# Altium schematic symbol library Minh_Lib.SchLib: 619 symbols (part 3 of 4) (continued)
## EEE-1EA470WP
designator EEE?  Supplier Part Number 1: PCE3908CT-ND
Cap Aluminum 47uF 25V 20% (6.3 X 5.4mm) SMD 70mA 1000h 85°C T/R; Manufacturer: Panasonic; Manufacturer Part Number: EEE-1EA470WP; Life (Hours): 1000Hour; Supplier 1: Digi-Key; RoHS: Yes; Category: Aluminum Electrolytic Capacitors; Stock 1: 2589; Pricing 1: 1=0.45000, 10=0.31200, 50=0.21860, 100=0.18730, 500=0.14050 (USD); Mount: Surface Mount,PCB; Case/Package: Radial; Contact Plating: Tin; Min Operating Temperature: -40°C; Max Operating Temperature: 85°C; Capacitance: 47uF; Tolerance: 20%; Ripple Current: 70mA; Packaging: Tape and Reel; Voltage Rating: 25V; Voltage Rating (DC): 25V; Package Quantity: 1; Termination: SMD/SMT; Ripple Current (AC): 70mA; Series: S; Construction: Cylindrical; Diameter: 6.3mm; Length: 5.5mm; Height: 5.4mm; Height - Seated (Max): 0.213inch; Radiation Hardening: No; RoHS Compliant: Yes; REACH SVHC: Unknown; Lead Free: Lead Free; ComponentLink1URL: https://datasheet.ciiva.com/34302/1356009-34302242.pdf?src-supplier=Jameco; ComponentLink1Description: https://datasheet.ciiva.com/34302/1356009-34302242.pdf?src-supplier=Jameco; ComponentLink2URL: https://datasheet.ciiva.com/24068/aba0000ce2-40801-24068439.pdf?src-supplier=Mouser; ComponentLink2Description: https://datasheet.ciiva.com/24068/aba0000ce2-40801-24068439.pdf?src-supplier=Mouser; ComponentLink3URL: https://datasheet.ciiva.com/14599/70255710-14599015.pdf?src-supplier=Allied+Electronics; ComponentLink3Description: https://datasheet.ciiva.com/14599/70255710-14599015.pdf?src-supplier=Allied+Electronics; ComponentLink4URL: https://datasheet.ciiva.com/2985/aba0000ce2-2985137.pdf?src-supplier=Avnet; ComponentLink4Description: https://datasheet.ciiva.com/2985/aba0000ce2-2985137.pdf?src-supplier=Avnet; ComponentLink5URL: https://datasheet.ciiva.com/16201/aba0000ce2-16201990.pdf?src-supplier=Future+Electronics; ComponentLink5Description: https://datasheet.ciiva.com/16201/aba0000ce2-16201990.pdf?src-supplier=Future+Electronics; ComponentLink6URL: https://datasheet.ciiva.com/30153/11aba0000ce2-30153223.pdf?src-supplier=Onlinecomponents.com; ComponentLink6Description: https://datasheet.ciiva.com/30153/11aba0000ce2-30153223.pdf?src-supplier=Onlinecomponents.com; ComponentLink7URL: https://datasheet.ciiva.com/15166/getdatasheetpartid-135372-15166029.pdf?src-supplier=Verical; ComponentLink7Description: https://datasheet.ciiva.com/15166/getdatasheetpartid-135372-15166029.pdf?src-supplier=Verical; ComponentLink8URL: https://datasheet.ciiva.com/17536/aba0000ce2-17536076.pdf?src-supplier=Avnet+Europe; ComponentLink8Description: https://datasheet.ciiva.com/17536/aba0000ce2-17536076.pdf?src-supplier=Avnet+Europe; ComponentLink9URL: https://datasheet.ciiva.com/16539/aba0000ce2-16539946.pdf?src-supplier=Avnet+Asia; ComponentLink9Description: https://datasheet.ciiva.com/16539/aba0000ce2-16539946.pdf?src-supplier=Avnet+Asia
footprint CAPACITOR/ALU - SIZE D/SMD - 6.3X5.4 (CAPACITOR  -  ALUMINIUM - SIZE D / EEEFK - SMD)
pins: 1, 2
text: +

## EEE-1EA471P
designator EEE?  Supplier Part Number 1: PCE3909CT-ND
Cap Aluminum 470uF 25V 20% (10 X 10.2mm) SMD 380mA 2000h 85 C T/R; Manufacturer: Panasonic; Manufacturer Part Number: EEE-1EA471P; Dielectric Material: Aluminium; Polarity: Polar; Life (Hours): 2000Hour; Leakage Current: 117.5uA; Supplier 1: Digi-Key; RoHS: Yes; Category: Aluminum Electrolytic Capacitors; Pricing 1: 1=0.84000, 10=0.59100, 50=0.44700, 100=0.38940 (USD); Mount: Surface Mount,PCB; Case/Package: Radial; Contact Plating: Tin; Min Operating Temperature: -40°C; Max Operating Temperature: 85°C; Packaging: Tape and Reel; Capacitance: 470uF; Voltage Rating: 25V; Ripple Current (AC): 380mA; Tolerance: 20%; Ripple Current: 380mA; Voltage Rating (DC): 25V; Package Quantity: 500; Termination: SMD/SMT; Voltage: 25V; Series: S; Construction: Cylindrical; Diameter: 10mm; Length: 10.5mm; Height: 10.2mm; Height - Seated (Max): 0.402inch; Radiation Hardening: No; REACH SVHC: No SVHC; Lead Free: Lead Free; RoHS Compliant: Yes; ComponentLink1URL: https://datasheet.ciiva.com/31414/aba0000ce2-31414667.pdf?src-supplier=Farnell; ComponentLink1Description: https://datasheet.ciiva.com/31414/aba0000ce2-31414667.pdf?src-supplier=Farnell; ComponentLink2URL: https://datasheet.ciiva.com/46374/aba0000ce2-46374389.pdf?src-supplier=Element14; ComponentLink2Description: https://datasheet.ciiva.com/46374/aba0000ce2-46374389.pdf?src-supplier=Element14; ComponentLink3URL: https://datasheet.ciiva.com/14605/70255710-14605533.pdf?src-supplier=Allied+Electronics; ComponentLink3Description: https://datasheet.ciiva.com/14605/70255710-14605533.pdf?src-supplier=Allied+Electronics; ComponentLink4URL: https://datasheet.ciiva.com/14600/70255710-14600730.pdf?src-supplier=Allied+Electronics; ComponentLink4Description: https://datasheet.ciiva.com/14600/70255710-14600730.pdf?src-supplier=Allied+Electronics; ComponentLink5URL: https://datasheet.ciiva.com/2983/aba0000ce2-2983917.pdf?src-supplier=Avnet; ComponentLink5Description: https://datasheet.ciiva.com/2983/aba0000ce2-2983917.pdf?src-supplier=Avnet; ComponentLink6URL: https://datasheet.ciiva.com/16426/aba0000ce2-16426393.pdf?src-supplier=Future+Electronics; ComponentLink6Description: https://datasheet.ciiva.com/16426/aba0000ce2-16426393.pdf?src-supplier=Future+Electronics; ComponentLink7URL: https://datasheet.ciiva.com/17534/aba0000ce2-17534509.pdf?src-supplier=Avnet+Europe; ComponentLink7Description: https://datasheet.ciiva.com/17534/aba0000ce2-17534509.pdf?src-supplier=Avnet+Europe
footprint CAPACITOR/ALU - SIZE G/SMD - 10X10.2 (CAPACITOR  -  ALUMINIUM - SIZE G / EEEFK - SMD)
pins: 1, 2
text: +

## EEE-1HA2R2SR
designator EEE?  Supplier Part Number 1: 5369950
2.2uF 50 V dc Aluminium Electrolytic Capacitor; SV Series 2000h 4 (Dia.) x 5.4mm; Manufacturer: Panasonic; Manufacturer Part Number: EEE-1HA2R2SR; Ripple Current: 16mA; Tolerance: 20%; Voltage Rating: 50V; Polarity: Polar; Life (Hours): 2000Hour; Leakage Current: 3uA; Lead Length: 1.8mm; Supplier 1: RSComponents; RoHS: Yes; Category: Aluminum Electrolytic Capacitors; Stock 1: 490; Pricing 1: 5=0.21900, 25=0.21600, 375=0.11900, 1250=0.08900, 5=0.15800, 25=0.15600, 375=0.08600, 1250=0.06400 (USD); Mount: Surface Mount,PCB; Case/Package: Radial; Number of Pins: 2; Contact Plating: Tin; Dielectric Material: Aluminium; Min Operating Temperature: -40°C; Max Operating Temperature: 85°C; Capacitance: 2.2uF; Packaging: Tape and Reel; Package Quantity: 2000; Ripple Current (AC): 16mA; Voltage Rating (DC): 50V; Termination: SMD/SMT; Voltage: 50V; Series: S; Construction: Cylindrical; Diameter: 4mm; Length: 5.5mm; Width: 4.3mm; Height: 5.4mm; Height - Seated (Max): 0.213inch; Lead Pitch: 1mm; Radiation Hardening: No; REACH SVHC: No SVHC; Lead Free: Lead Free; RoHS Compliant: Yes; ComponentLink1URL: https://datasheet.ciiva.com/25613/0900766b8078636e-25613663.pdf?src-supplier=RSComponents; ComponentLink1Description: https://datasheet.ciiva.com/25613/0900766b8078636e-25613663.pdf?src-supplier=RSComponents; ComponentLink2URL: https://datasheet.ciiva.com/11784/0900766b8078636e-11784625.pdf?src-supplier=RSComponents; ComponentLink2Description: https://datasheet.ciiva.com/11784/0900766b8078636e-11784625.pdf?src-supplier=RSComponents; ComponentLink3URL: https://datasheet.ciiva.com/24027/aba0000ce2-40801-24027359.pdf?src-supplier=Mouser; ComponentLink3Description: https://datasheet.ciiva.com/24027/aba0000ce2-40801-24027359.pdf?src-supplier=Mouser; ComponentLink4URL: https://datasheet.ciiva.com/14604/70255710-14604635.pdf?src-supplier=Allied+Electronics; ComponentLink4Description: https://datasheet.ciiva.com/14604/70255710-14604635.pdf?src-supplier=Allied+Electronics; ComponentLink5URL: https://datasheet.ciiva.com/43485/aba0000ce2-43485622.pdf?src-supplier=Farnell; ComponentLink5Description: https://datasheet.ciiva.com/43485/aba0000ce2-43485622.pdf?src-supplier=Farnell; ComponentLink6URL: https://datasheet.ciiva.com/46387/aba0000ce2-46387980.pdf?src-supplier=Element14; ComponentLink6Description: https://datasheet.ciiva.com/46387/aba0000ce2-46387980.pdf?src-supplier=Element14; ComponentLink7URL: https://datasheet.ciiva.com/46376/aba0000ce2-46376363.pdf?src-supplier=Element14; ComponentLink7Description: https://datasheet.ciiva.com/46376/aba0000ce2-46376363.pdf?src-supplier=Element14; ComponentLink8URL: https://datasheet.ciiva.com/2985/aba0000ce2-2985163.pdf?src-supplier=Avnet; ComponentLink8Description: https://datasheet.ciiva.com/2985/aba0000ce2-2985163.pdf?src-supplier=Avnet; ComponentLink9URL: https://datasheet.ciiva.com/15166/getdatasheetpartid-178541-15166252.pdf?src-supplier=Verical; ComponentLink9Description: https://datasheet.ciiva.com/15166/getdatasheetpartid-178541-15166252.pdf?src-supplier=Verical; ComponentLink10URL: https://datasheet.ciiva.com/30177/11aba0000ce2-30177741.pdf?src-supplier=Onlinecomponents.com; ComponentLink10Description: https://datasheet.ciiva.com/30177/11aba0000ce2-30177741.pdf?src-supplier=Onlinecomponents.com
footprint CAPACITOR/ALU - SIZE B/SMD - 4X5.4 (CAPACITOR  -  ALUMINIUM - SIZE B / EEEFK - SMD)
pins: 1, 2
text: +

## EEE-1HA3R3SR
designator EEE?  Supplier Part Number 1: EEE-1HA3R3SR
Cap Aluminum 3.3uF 50V 20% (4 X 5.4mm) SMD 16mA 2000 hr 85°C T/R; Manufacturer: Panasonic; Dielectric Material: Aluminium; Life (Hours): 2000Hour; Polarity: Polar; Leakage Current: 3uA; Lead Length: 1.8mm; Supplier 1: Arrow Electronics; Manufacturer Part Number: EEE-1HA3R3SR; RoHS: Yes; Category: Aluminum Electrolytic Capacitors; Stock 1: 1; Pricing 1: 1=0.18170 (USD); Mount: Surface Mount,PCB; Case/Package: Radial; Number of Pins: 2; Min Operating Temperature: -40°C; Max Operating Temperature: 85°C; Capacitance: 3.3uF; Voltage Rating: 50V; Packaging: Tape and Reel; Tolerance: 20%; Voltage Rating (DC): 50V; Package Quantity: 2000; Ripple Current (AC): 16mA; Ripple Current: 16mA; Termination: SMD/SMT; Voltage: 50V; Series: S; Construction: Cylindrical; Diameter: 4mm; Length: 5.5mm; Width: 4.3mm; Height: 5.4mm; Height - Seated (Max): 0.213inch; Lead Pitch: 1mm; Radiation Hardening: No; Lead Free: Lead Free; REACH SVHC: No SVHC; RoHS Compliant: Yes; ComponentLink1URL: https://datasheet.ciiva.com/11784/0900766b8078636e-11784642.pdf?src-supplier=RSComponents; ComponentLink1Description: https://datasheet.ciiva.com/11784/0900766b8078636e-11784642.pdf?src-supplier=RSComponents; ComponentLink2URL: https://datasheet.ciiva.com/43485/aba0000ce2-43485623.pdf?src-supplier=Farnell; ComponentLink2Description: https://datasheet.ciiva.com/43485/aba0000ce2-43485623.pdf?src-supplier=Farnell; ComponentLink3URL: https://datasheet.ciiva.com/46376/aba0000ce2-46376362.pdf?src-supplier=Element14; ComponentLink3Description: https://datasheet.ciiva.com/46376/aba0000ce2-46376362.pdf?src-supplier=Element14; ComponentLink4URL: https://datasheet.ciiva.com/2985/aba0000ce2-2985170.pdf?src-supplier=Avnet; ComponentLink4Description: https://datasheet.ciiva.com/2985/aba0000ce2-2985170.pdf?src-supplier=Avnet; ComponentLink5URL: https://datasheet.ciiva.com/16390/aba0000ce2-16390475.pdf?src-supplier=Future+Electronics; ComponentLink5Description: https://datasheet.ciiva.com/16390/aba0000ce2-16390475.pdf?src-supplier=Future+Electronics
footprint CAPACITOR/ALU - SIZE B/SMD - 4X5.4 (CAPACITOR  -  ALUMINIUM - SIZE B / EEEFK - SMD)
pins: 1, 2
text: +

## EEE-1HA4R7SR
designator EEE?  Supplier Part Number 1: 7271054
Cap Aluminum 4.7uF 50V 20% (5 X 5.4mm) SMD 23mA 2000 hr 85°C T/R; Manufacturer: Panasonic; Manufacturer Part Number: EEE-1HA4R7SR; Dielectric Material: Aluminium; Life (Hours): 2000Hour; Leakage Current: 3uA; Lead Length: 2.2mm; Supplier 1: RSComponents; RoHS: Yes; Category: Aluminum Electrolytic Capacitors; Stock 1: 46225; Pricing 1: 25=0.24000, 50=0.20400, 100=0.18000, 500=0.15500, 2000=0.14400, 25=0.17300, 50=0.14700, 100=0.13000, 500=0.11200, 2000=0.10400 (USD); Mount: Surface Mount,PCB; Case/Package: Radial; Number of Pins: 2; Contact Plating: Tin; Min Operating Temperature: -40°C; Max Operating Temperature: 85°C; Capacitance: 4.7uF; Voltage Rating: 50V; Packaging: Tape and Reel; Tolerance: 20%; Voltage Rating (DC): 50V; Package Quantity: 1; Termination: SMD/SMT; Voltage: 50V; Series: S; Ripple Current (AC): 23mA; Ripple Current: 23mA; Construction: Cylindrical; Diameter: 5mm; Length: 5.5mm; Width: 5.3mm; Height: 5.4mm; Height - Seated (Max): 0.213inch; Lead Pitch: 1.5mm; Radiation Hardening: No; REACH SVHC: No SVHC; RoHS Compliant: Yes; Lead Free: Lead Free; ComponentLink1URL: https://datasheet.ciiva.com/11784/0900766b80f32c0f-11784877.pdf?src-supplier=RSComponents; ComponentLink1Description: https://datasheet.ciiva.com/11784/0900766b80f32c0f-11784877.pdf?src-supplier=RSComponents; ComponentLink2URL: https://datasheet.ciiva.com/24071/aba0000ce2-40801-24071194.pdf?src-supplier=Mouser; ComponentLink2Description: https://datasheet.ciiva.com/24071/aba0000ce2-40801-24071194.pdf?src-supplier=Mouser; ComponentLink3URL: https://datasheet.ciiva.com/14608/70255710-14608013.pdf?src-supplier=Allied+Electronics; ComponentLink3Description: https://datasheet.ciiva.com/14608/70255710-14608013.pdf?src-supplier=Allied+Electronics; ComponentLink4URL: https://datasheet.ciiva.com/14600/70255710-14600057.pdf?src-supplier=Allied+Electronics; ComponentLink4Description: https://datasheet.ciiva.com/14600/70255710-14600057.pdf?src-supplier=Allied+Electronics; ComponentLink5URL: https://datasheet.ciiva.com/43485/aba0000ce2-43485624.pdf?src-supplier=Farnell; ComponentLink5Description: https://datasheet.ciiva.com/43485/aba0000ce2-43485624.pdf?src-supplier=Farnell; ComponentLink6URL: https://datasheet.ciiva.com/46376/aba0000ce2-46376361.pdf?src-supplier=Element14; ComponentLink6Description: https://datasheet.ciiva.com/46376/aba0000ce2-46376361.pdf?src-supplier=Element14; ComponentLink7URL: https://datasheet.ciiva.com/2985/aba0000ce2-2985178.pdf?src-supplier=Avnet; ComponentLink7Description: https://datasheet.ciiva.com/2985/aba0000ce2-2985178.pdf?src-supplier=Avnet; ComponentLink8URL: https://datasheet.ciiva.com/16426/aba0000ce2-16426997.pdf?src-supplier=Future+Electronics; ComponentLink8Description: https://datasheet.ciiva.com/16426/aba0000ce2-16426997.pdf?src-supplier=Future+Electronics; ComponentLink9URL: https://datasheet.ciiva.com/30131/11aba0000ce2-30131807.pdf?src-supplier=Onlinecomponents.com; ComponentLink9Description: https://datasheet.ciiva.com/30131/11aba0000ce2-30131807.pdf?src-supplier=Onlinecomponents.com; ComponentLink10URL: https://datasheet.ciiva.com/16539/aba0000ce2-16539951.pdf?src-supplier=Avnet+Asia; ComponentLink10Description: https://datasheet.ciiva.com/16539/aba0000ce2-16539951.pdf?src-supplier=Avnet+Asia
footprint CAPACITOR/ALU - SIZE C/SMD - 5X5.4 (CAPACITOR  -  ALUMINIUM - SIZE C / EEEFK - SMD)
pins: 1, 2
text: +

## EEE-1HA4R7WR
designator EEE?  Supplier Part Number 1: 667-EEE-1HA4R7WR
Cap Aluminum 4.7uF 50V 20% (4 X 5.4mm) SMD 18mA 1000h 85°C T/R; Manufacturer: Panasonic; Manufacturer Part Number: EEE-1HA4R7WR; Polarity: Polar; Life (Hours): 1000Hour; Supplier 1: Mouser; RoHS: Yes; Category: Aluminum Electrolytic Capacitors; Stock 1: 6; Pricing 1: 1=0.36000, 10=0.25000, 50=0.25000, 100=0.14200, 1000=0.08800, 10000=0.08300 (USD); Mount: Surface Mount,PCB; Case/Package: Radial; Contact Plating: Tin; Min Operating Temperature: -40°C; Max Operating Temperature: 85°C; Capacitance: 4.7uF; Tolerance: 20%; Voltage Rating: 50V; Packaging: Tape and Reel; Ripple Current: 18mA; Package Quantity: 2000; Voltage Rating (DC): 50V; Termination: SMD/SMT; Ripple Current (AC): 18mA; Series: S; Construction: Cylindrical; Diameter: 4mm; Length: 5.5mm; Height: 5.4mm; Height - Seated (Max): 0.213inch; Radiation Hardening: No; Lead Free: Lead Free; RoHS Compliant: Yes; REACH SVHC: No SVHC; ComponentLink1URL: https://datasheet.ciiva.com/43470/aba0000ce2-43470678.pdf?src-supplier=Farnell; ComponentLink1Description: https://datasheet.ciiva.com/43470/aba0000ce2-43470678.pdf?src-supplier=Farnell; ComponentLink2URL: https://datasheet.ciiva.com/46378/aba0000ce2-46378350.pdf?src-supplier=Element14; ComponentLink2Description: https://datasheet.ciiva.com/46378/aba0000ce2-46378350.pdf?src-supplier=Element14; ComponentLink3URL: https://datasheet.ciiva.com/31414/aba0000ce2-31414686.pdf?src-supplier=Farnell; ComponentLink3Description: https://datasheet.ciiva.com/31414/aba0000ce2-31414686.pdf?src-supplier=Farnell; ComponentLink4URL: https://datasheet.ciiva.com/24069/aba0000ce2-40801-24069903.pdf?src-supplier=Mouser; ComponentLink4Description: https://datasheet.ciiva.com/24069/aba0000ce2-40801-24069903.pdf?src-supplier=Mouser; ComponentLink5URL: https://datasheet.ciiva.com/14600/70255710-14600316.pdf?src-supplier=Allied+Electronics; ComponentLink5Description: https://datasheet.ciiva.com/14600/70255710-14600316.pdf?src-supplier=Allied+Electronics; ComponentLink6URL: https://datasheet.ciiva.com/14592/70255710-14592504.pdf?src-supplier=Allied+Electronics; ComponentLink6Description: https://datasheet.ciiva.com/14592/70255710-14592504.pdf?src-supplier=Allied+Electronics; ComponentLink7URL: https://datasheet.ciiva.com/2985/aba0000ce2-2985181.pdf?src-supplier=Avnet; ComponentLink7Description: https://datasheet.ciiva.com/2985/aba0000ce2-2985181.pdf?src-supplier=Avnet; ComponentLink8URL: https://datasheet.ciiva.com/16393/aba0000ce2-16393141.pdf?src-supplier=Future+Electronics; ComponentLink8Description: https://datasheet.ciiva.com/16393/aba0000ce2-16393141.pdf?src-supplier=Future+Electronics; ComponentLink9URL: https://datasheet.ciiva.com/30116/11aba0000ce2-30116602.pdf?src-supplier=Onlinecomponents.com; ComponentLink9Description: https://datasheet.ciiva.com/30116/11aba0000ce2-30116602.pdf?src-supplier=Onlinecomponents.com
footprint CAPACITOR/ALU - SIZE B/SMD - 4X5.4 (CAPACITOR  -  ALUMINIUM - SIZE B / EEEFK - SMD)
pins: 1, 2
text: +

## EEE-1HA010SR
designator EEE?  Supplier Part Number 1: 5369922
Cap Aluminum 1uF 50V 20% (4 X 5.4mm) SMD 10mA 2000h 85°C T/R; Manufacturer: Panasonic; Manufacturer Part Number: EEE-1HA010SR; Dielectric Material: Aluminium; Polarity: Polar; Life (Hours): 2000Hour; Leakage Current: 3uA; Lead Length: 1.8mm; Supplier 1: RSComponents; RoHS: Yes; Category: Aluminum Electrolytic Capacitors; Stock 1: 3070; Pricing 1: 5=0.24100, 50=0.15500, 100=0.14700, 500=0.11100, 1000=0.09700, 5=0.17400, 50=0.11200, 100=0.10600, 500=0.08000, 1000=0.07000 (USD); Mount: Surface Mount,PCB; Case/Package: Radial; Number of Pins: 2; Contact Plating: Tin; Min Operating Temperature: -40°C; Max Operating Temperature: 85°C; Tolerance: 20%; Capacitance: 1uF; Packaging: Tape and Reel; Voltage Rating: 50V; Voltage Rating (DC): 50V; Package Quantity: 2000; Termination: SMD/SMT; Voltage: 50V; Series: S; Construction: Cylindrical; Ripple Current: 10mA; Ripple Current (AC): 10mA; Diameter: 4mm; Length: 5.5mm; Width: 4.3mm; Height: 5.4mm; Height - Seated (Max): 0.213inch; Lead Pitch: 1mm; Radiation Hardening: No; RoHS Compliant: Yes; REACH SVHC: No SVHC; Lead Free: Lead Free; ComponentLink1URL: https://datasheet.ciiva.com/34302/1356113-34302243.pdf?src-supplier=Jameco; ComponentLink1Description: https://datasheet.ciiva.com/34302/1356113-34302243.pdf?src-supplier=Jameco; ComponentLink2URL: https://datasheet.ciiva.com/11778/0900766b8078636e-11778406.pdf?src-supplier=RSComponents; ComponentLink2Description: https://datasheet.ciiva.com/11778/0900766b8078636e-11778406.pdf?src-supplier=RSComponents; ComponentLink3URL: https://datasheet.ciiva.com/24023/aba0000ce2-40801-24023829.pdf?src-supplier=Mouser; ComponentLink3Description: https://datasheet.ciiva.com/24023/aba0000ce2-40801-24023829.pdf?src-supplier=Mouser; ComponentLink4URL: https://datasheet.ciiva.com/43485/aba0000ce2-43485621.pdf?src-supplier=Farnell; ComponentLink4Description: https://datasheet.ciiva.com/43485/aba0000ce2-43485621.pdf?src-supplier=Farnell; ComponentLink5URL: https://datasheet.ciiva.com/46387/aba0000ce2-46387976.pdf?src-supplier=Element14; ComponentLink5Description: https://datasheet.ciiva.com/46387/aba0000ce2-46387976.pdf?src-supplier=Element14; ComponentLink6URL: https://datasheet.ciiva.com/6059/aba0000ce2-6059903.pdf?src-supplier=Farnell; ComponentLink6Description: https://datasheet.ciiva.com/6059/aba0000ce2-6059903.pdf?src-supplier=Farnell; ComponentLink7URL: https://datasheet.ciiva.com/46376/aba0000ce2-46376366.pdf?src-supplier=Element14; ComponentLink7Description: https://datasheet.ciiva.com/46376/aba0000ce2-46376366.pdf?src-supplier=Element14; ComponentLink8URL: https://datasheet.ciiva.com/2985/aba0000ce2-2985145.pdf?src-supplier=Avnet; ComponentLink8Description: https://datasheet.ciiva.com/2985/aba0000ce2-2985145.pdf?src-supplier=Avnet; ComponentLink9URL: https://datasheet.ciiva.com/3773/41677485s8438002n1386-3773589.pdf?src-supplier=Arrow+Electronics; ComponentLink9Description: https://datasheet.ciiva.com/3773/41677485s8438002n1386-3773589.pdf?src-supplier=Arrow+Electronics; ComponentLink10URL: https://datasheet.ciiva.com/16449/aba0000ce2-16449541.pdf?src-supplier=Future+Electronics; ComponentLink10Description: https://datasheet.ciiva.com/16449/aba0000ce2-16449541.pdf?src-supplier=Future+Electronics; ComponentLink11URL: https://datasheet.ciiva.com/17537/aba0000ce2-17537068.pdf?src-supplier=Avnet+Europe; ComponentLink11Description: https://datasheet.ciiva.com/17537/aba0000ce2-17537068.pdf?src-supplier=Avnet+Europe
footprint CAPACITOR/ALU - SIZE B/SMD - 4X5.4 (CAPACITOR  -  ALUMINIUM - SIZE B / EEEFK - SMD)
pins: 1, 2
text: +

## EEE-1HA100SP
designator EEE?  Supplier Part Number 1: 5369944
Cap Aluminum 10uF 50V 20% (6.3 X 5.4mm) SMD 35mA 2000h 85 C T/R; Manufacturer: Panasonic; Manufacturer Part Number: EEE-1HA100SP; Polarity: Polar; Life (Hours): 2000Hour; Leakage Current: 3uA; Lead Length: 2.6mm; Supplier 1: RSComponents; RoHS: Yes; Category: Aluminum Electrolytic Capacitors; Stock 1: 1; Pricing 1: 5=0.36000, 250=0.15000, 500=0.10500, 2500=0.07500, 5000=0.07200 (USD); Mount: Surface Mount,PCB; Case/Package: Radial; Number of Pins: 2; Contact Plating: Tin; Min Operating Temperature: -40°C; Max Operating Temperature: 85°C; Capacitance: 10uF; Tolerance: 20%; Ripple Current: 35mA; Packaging: Tape and Reel; Voltage Rating (DC): 50V; Voltage Rating: 50V; Package Quantity: 1; Ripple Current (AC): 35mA; Termination: SMD/SMT; Voltage: 50V; Series: S; Construction: Cylindrical; Diameter: 6.3mm; Length: 5.5mm; Width: 6.6mm; Height: 5.4mm; Height - Seated (Max): 0.213inch; Lead Pitch: 1.8mm; Radiation Hardening: No; REACH SVHC: No SVHC; RoHS Compliant: Yes; ComponentLink1URL: https://datasheet.ciiva.com/11784/0900766b8078636e-11784606.pdf?src-supplier=RSComponents; ComponentLink1Description: https://datasheet.ciiva.com/11784/0900766b8078636e-11784606.pdf?src-supplier=RSComponents; ComponentLink2URL: https://datasheet.ciiva.com/24025/aba0000ce2-40801-24025692.pdf?src-supplier=Mouser; ComponentLink2Description: https://datasheet.ciiva.com/24025/aba0000ce2-40801-24025692.pdf?src-supplier=Mouser; ComponentLink3URL: https://datasheet.ciiva.com/14593/70255710-14593928.pdf?src-supplier=Allied+Electronics; ComponentLink3Description: https://datasheet.ciiva.com/14593/70255710-14593928.pdf?src-supplier=Allied+Electronics; ComponentLink4URL: https://datasheet.ciiva.com/43485/aba0000ce2-43485625.pdf?src-supplier=Farnell; ComponentLink4Description: https://datasheet.ciiva.com/43485/aba0000ce2-43485625.pdf?src-supplier=Farnell; ComponentLink5URL: https://datasheet.ciiva.com/46387/aba0000ce2-46387978.pdf?src-supplier=Element14; ComponentLink5Description: https://datasheet.ciiva.com/46387/aba0000ce2-46387978.pdf?src-supplier=Element14; ComponentLink6URL: https://datasheet.ciiva.com/46376/aba0000ce2-46376364.pdf?src-supplier=Element14; ComponentLink6Description: https://datasheet.ciiva.com/46376/aba0000ce2-46376364.pdf?src-supplier=Element14; ComponentLink7URL: https://datasheet.ciiva.com/10330/aba0000ce2-10330991.pdf?src-supplier=Avnet; ComponentLink7Description: https://datasheet.ciiva.com/10330/aba0000ce2-10330991.pdf?src-supplier=Avnet; ComponentLink8URL: https://datasheet.ciiva.com/16397/aba0000ce2-16397354.pdf?src-supplier=Future+Electronics; ComponentLink8Description: https://datasheet.ciiva.com/16397/aba0000ce2-16397354.pdf?src-supplier=Future+Electronics; ComponentLink9URL: https://datasheet.ciiva.com/30261/11aba0000ce2-30261191.pdf?src-supplier=Onlinecomponents.com; ComponentLink9Description: https://datasheet.ciiva.com/30261/11aba0000ce2-30261191.pdf?src-supplier=Onlinecomponents.com
footprint CAPACITOR/ALU - SIZE D/SMD - 6.3X5.4 (CAPACITOR  -  ALUMINIUM - SIZE D / EEEFK - SMD)
pins: 1, 2
text: +

## EEE-1HA100WR
designator EEE?  Supplier Part Number 1: EEE-1HA100WR
Cap Aluminum 10uF 50V 20% (5 X 5.4mm) SMD 27mA 1000h 85°C T/R; Manufacturer: Panasonic; Life (Hours): 1000Hour; Supplier 1: Avnet; Manufacturer Part Number: EEE-1HA100WR; RoHS: Yes; Category: Aluminum Electrolytic Capacitors; Stock 1: 4; Pricing 1: 1=0.05300, 16=0.05173, 32=0.05046, 63=0.04918, 125=0.04791 (USD); Mount: Surface Mount,PCB; Case/Package: Radial; Contact Plating: Tin; Min Operating Temperature: -40°C; Max Operating Temperature: 85°C; Packaging: Tape and Reel; Capacitance: 10uF; Tolerance: 20%; Ripple Current: 27mA; Voltage Rating: 50V; Ripple Current (AC): 27mA; Voltage Rating (DC): 50V; Package Quantity: 1; Termination: SMD/SMT; Series: S; Construction: Cylindrical; Diameter: 5mm; Length: 5.5mm; Height: 5.4mm; Height - Seated (Max): 0.213inch; Radiation Hardening: No; REACH SVHC: Unknown; Lead Free: Lead Free; RoHS Compliant: Yes; ComponentLink1URL: https://datasheet.ciiva.com/24068/aba0000ce2-40801-24068271.pdf?src-supplier=Mouser; ComponentLink1Description: https://datasheet.ciiva.com/24068/aba0000ce2-40801-24068271.pdf?src-supplier=Mouser; ComponentLink2URL: https://datasheet.ciiva.com/14596/70255710-14596111.pdf?src-supplier=Allied+Electronics; ComponentLink2Description: https://datasheet.ciiva.com/14596/70255710-14596111.pdf?src-supplier=Allied+Electronics; ComponentLink3URL: https://datasheet.ciiva.com/14609/70255710-14609462.pdf?src-supplier=Allied+Electronics; ComponentLink3Description: https://datasheet.ciiva.com/14609/70255710-14609462.pdf?src-supplier=Allied+Electronics; ComponentLink4URL: https://datasheet.ciiva.com/16205/aba0000ce2-16205645.pdf?src-supplier=Future+Electronics; ComponentLink4Description: https://datasheet.ciiva.com/16205/aba0000ce2-16205645.pdf?src-supplier=Future+Electronics; ComponentLink5URL: https://datasheet.ciiva.com/30053/11aba0000ce2-30053976.pdf?src-supplier=Onlinecomponents.com; ComponentLink5Description: https://datasheet.ciiva.com/30053/11aba0000ce2-30053976.pdf?src-supplier=Onlinecomponents.com; ComponentLink6URL: https://datasheet.ciiva.com/17536/aba0000ce2-17536791.pdf?src-supplier=Avnet+Europe; ComponentLink6Description: https://datasheet.ciiva.com/17536/aba0000ce2-17536791.pdf?src-supplier=Avnet+Europe
footprint CAPACITOR/ALU - SIZE C/SMD - 5X5.4 (CAPACITOR  -  ALUMINIUM - SIZE C / EEEFK - SMD)
pins: 1, 2
text: +

## EEE-1HA101P
designator EEE?  Supplier Part Number 1: PCE3916CT-ND
Cap Aluminum 100uF 50V 20% (10 X 10.2mm) SMD 250mA 2000 hr 85°C T/R; Manufacturer: Panasonic; Manufacturer Part Number: EEE-1HA101P; Life (Hours): 2000Hour; Supplier 1: Digi-Key; RoHS: Yes; Category: Aluminum Electrolytic Capacitors; Pricing 1: 1=0.76000, 10=0.53800, 50=0.40720, 100=0.35460 (USD); Mount: Surface Mount,PCB; Case/Package: Radial; Contact Plating: Tin; Min Operating Temperature: -40°C; Max Operating Temperature: 85°C; Capacitance: 100uF; Voltage Rating: 50V; Tolerance: 20%; Ripple Current: 250mA; Packaging: Tape and Reel; Package Quantity: 1; Ripple Current (AC): 250mA; Voltage Rating (DC): 50V; Termination: SMD/SMT; Series: S; Construction: Cylindrical; Diameter: 10mm; Length: 10.5mm; Height: 10.2mm; Height - Seated (Max): 0.402inch; Radiation Hardening: No; REACH SVHC: No SVHC; Lead Free: Lead Free; RoHS Compliant: Yes; ComponentLink1URL: https://datasheet.ciiva.com/24025/aba0000ce2-40801-24025551.pdf?src-supplier=Mouser; ComponentLink1Description: https://datasheet.ciiva.com/24025/aba0000ce2-40801-24025551.pdf?src-supplier=Mouser; ComponentLink2URL: https://datasheet.ciiva.com/14600/70255710-14600136.pdf?src-supplier=Allied+Electronics; ComponentLink2Description: https://datasheet.ciiva.com/14600/70255710-14600136.pdf?src-supplier=Allied+Electronics; ComponentLink3URL: https://datasheet.ciiva.com/14607/70255710-14607915.pdf?src-supplier=Allied+Electronics; ComponentLink3Description: https://datasheet.ciiva.com/14607/70255710-14607915.pdf?src-supplier=Allied+Electronics; ComponentLink4URL: https://datasheet.ciiva.com/2985/aba0000ce2-2985150.pdf?src-supplier=Avnet; ComponentLink4Description: https://datasheet.ciiva.com/2985/aba0000ce2-2985150.pdf?src-supplier=Avnet; ComponentLink5URL: https://datasheet.ciiva.com/16432/aba0000ce2-16432891.pdf?src-supplier=Future+Electronics; ComponentLink5Description: https://datasheet.ciiva.com/16432/aba0000ce2-16432891.pdf?src-supplier=Future+Electronics; ComponentLink6URL: https://datasheet.ciiva.com/2985/aba0000ce2-2985151.pdf?src-supplier=Avnet; ComponentLink6Description: https://datasheet.ciiva.com/2985/aba0000ce2-2985151.pdf?src-supplier=Avnet
footprint CAPACITOR/ALU - SIZE G/SMD - 10X10.2 (CAPACITOR  -  ALUMINIUM - SIZE G / EEEFK - SMD)
pins: 1, 2
text: +

## EEE-1HA101UP
designator EEE?  Supplier Part Number 1: PCE3917DKR-ND
Cap Aluminum 100uF 50V 20% (8 X 10.2mm) SMD 200mA 2000h 85°C T/R; Manufacturer: Panasonic; Manufacturer Part Number: EEE-1HA101UP; Life (Hours): 2000Hour; Supplier 1: Digi-Key; RoHS: Yes; Category: Aluminum Electrolytic Capacitors; Pricing 1: 1=0.71000, 10=0.49900, 50=0.37720, 100=0.32850 (USD); Mount: Surface Mount,PCB; Case/Package: Radial; Contact Plating: Tin; Min Operating Temperature: -40°C; Max Operating Temperature: 85°C; Capacitance: 100uF; Tolerance: 20%; Voltage Rating: 50V; Ripple Current (AC): 200mA; Packaging: Tape and Reel; Ripple Current: 200mA; Voltage Rating (DC): 50V; Package Quantity: 1; Termination: SMD/SMT; Series: S; Construction: Cylindrical; Diameter: 8mm; Length: 10.5mm; Height: 10.2mm; Height - Seated (Max): 0.402inch; Radiation Hardening: No; REACH SVHC: Unknown; Lead Free: Lead Free; RoHS Compliant: Yes; ComponentLink1URL: https://datasheet.ciiva.com/19458/1356308-19458345.pdf?src-supplier=Jameco; ComponentLink1Description: https://datasheet.ciiva.com/19458/1356308-19458345.pdf?src-supplier=Jameco; ComponentLink2URL: https://datasheet.ciiva.com/24073/aba0000ce2-40801-24073023.pdf?src-supplier=Mouser; ComponentLink2Description: https://datasheet.ciiva.com/24073/aba0000ce2-40801-24073023.pdf?src-supplier=Mouser; ComponentLink3URL: https://datasheet.ciiva.com/14600/70255710-14600015.pdf?src-supplier=Allied+Electronics; ComponentLink3Description: https://datasheet.ciiva.com/14600/70255710-14600015.pdf?src-supplier=Allied+Electronics; ComponentLink4URL: https://datasheet.ciiva.com/11680/aba0000ce2-11680247.pdf?src-supplier=Avnet; ComponentLink4Description: https://datasheet.ciiva.com/11680/aba0000ce2-11680247.pdf?src-supplier=Avnet; ComponentLink5URL: https://datasheet.ciiva.com/16397/aba0000ce2-16397743.pdf?src-supplier=Future+Electronics; ComponentLink5Description: https://datasheet.ciiva.com/16397/aba0000ce2-16397743.pdf?src-supplier=Future+Electronics; ComponentLink6URL: https://datasheet.ciiva.com/2983/aba0000ce2-2983919.pdf?src-supplier=Avnet; ComponentLink6Description: https://datasheet.ciiva.com/2983/aba0000ce2-2983919.pdf?src-supplier=Avnet; ComponentLink7URL: https://datasheet.ciiva.com/30180/11aba0000ce2-30180331.pdf?src-supplier=Onlinecomponents.com; ComponentLink7Description: https://datasheet.ciiva.com/30180/11aba0000ce2-30180331.pdf?src-supplier=Onlinecomponents.com; ComponentLink8URL: https://datasheet.ciiva.com/15165/getdatasheetpartid-111566-15165949.pdf?src-supplier=Verical; ComponentLink8Description: https://datasheet.ciiva.com/15165/getdatasheetpartid-111566-15165949.pdf?src-supplier=Verical; ComponentLink9URL: https://datasheet.ciiva.com/17530/aba0000ce2-17530365.pdf?src-supplier=Avnet+Europe; ComponentLink9Description: https://datasheet.ciiva.com/17530/aba0000ce2-17530365.pdf?src-supplier=Avnet+Europe
footprint CAPACITOR/ALU - SIZE F/SMD - 8X10.2 (CAPACITOR  -  ALUMINIUM - SIZE F / EEEFK - SMD)
pins: 1, 2
text: +

## EEE-1HA220P
designator EEE?  Supplier Part Number 1: PCE3918DKR-ND
Cap Aluminum 22uF 50V 20% (8 X 6.2mm) SMD 120mA 2000 hr 85°C T/R; Manufacturer: Panasonic; Manufacturer Part Number: EEE-1HA220P; Life (Hours): 2000Hour; Leakage Current: 3uA; Supplier 1: Digi-Key; RoHS: Yes; Category: Aluminum Electrolytic Capacitors; Pricing 1: 1=0.50000, 10=0.35500, 50=0.26800, 100=0.23350, 500=0.17296 (USD); Mount: Surface Mount,PCB; Case/Package: Radial; Contact Plating: Tin; Min Operating Temperature: -40°C; Max Operating Temperature: 85°C; Tolerance: 20%; Ripple Current: 120mA; Capacitance: 22uF; Voltage Rating (DC): 50V; Packaging: Tape and Reel; Package Quantity: 1; Voltage Rating: 50V; Ripple Current (AC): 120mA; Termination: SMD/SMT; Voltage: 50V; Series: S; Construction: Cylindrical; Diameter: 8mm; Length: 6.5mm; Height: 6.2mm; Height - Seated (Max): 0.244inch; Radiation Hardening: No; REACH SVHC: No SVHC; Lead Free: Lead Free; RoHS Compliant: Yes; ComponentLink1URL: https://datasheet.ciiva.com/11780/0900766b808a016a-11780633.pdf?src-supplier=RSComponents; ComponentLink1Description: https://datasheet.ciiva.com/11780/0900766b808a016a-11780633.pdf?src-supplier=RSComponents; ComponentLink2URL: https://datasheet.ciiva.com/43470/aba0000ce2-43470668.pdf?src-supplier=Farnell; ComponentLink2Description: https://datasheet.ciiva.com/43470/aba0000ce2-43470668.pdf?src-supplier=Farnell; ComponentLink3URL: https://datasheet.ciiva.com/46378/aba0000ce2-46378284.pdf?src-supplier=Element14; ComponentLink3Description: https://datasheet.ciiva.com/46378/aba0000ce2-46378284.pdf?src-supplier=Element14; ComponentLink4URL: https://datasheet.ciiva.com/46374/aba0000ce2-46374383.pdf?src-supplier=Element14; ComponentLink4Description: https://datasheet.ciiva.com/46374/aba0000ce2-46374383.pdf?src-supplier=Element14; ComponentLink5URL: https://datasheet.ciiva.com/24027/aba0000ce2-40801-24027061.pdf?src-supplier=Mouser; ComponentLink5Description: https://datasheet.ciiva.com/24027/aba0000ce2-40801-24027061.pdf?src-supplier=Mouser; ComponentLink6URL: https://datasheet.ciiva.com/14609/70255710-14609194.pdf?src-supplier=Allied+Electronics; ComponentLink6Description: https://datasheet.ciiva.com/14609/70255710-14609194.pdf?src-supplier=Allied+Electronics; ComponentLink7URL: https://datasheet.ciiva.com/10330/aba0000ce2-10330997.pdf?src-supplier=Avnet; ComponentLink7Description: https://datasheet.ciiva.com/10330/aba0000ce2-10330997.pdf?src-supplier=Avnet; ComponentLink8URL: https://datasheet.ciiva.com/16384/aba0000ce2-16384347.pdf?src-supplier=Future+Electronics; ComponentLink8Description: https://datasheet.ciiva.com/16384/aba0000ce2-16384347.pdf?src-supplier=Future+Electronics; ComponentLink9URL: https://datasheet.ciiva.com/15166/getdatasheetpartid-169249-15166140.pdf?src-supplier=Verical; ComponentLink9Description: https://datasheet.ciiva.com/15166/getdatasheetpartid-169249-15166140.pdf?src-supplier=Verical; ComponentLink10URL: https://datasheet.ciiva.com/30234/11aba0000ce2-30234139.pdf?src-supplier=Onlinecomponents.com; ComponentLink10Description: https://datasheet.ciiva.com/30234/11aba0000ce2-30234139.pdf?src-supplier=Onlinecomponents.com; ComponentLink11URL: https://datasheet.ciiva.com/17353/aba0000ce2-17353340.pdf?src-supplier=Avnet+Europe; ComponentLink11Description: https://datasheet.ciiva.com/17353/aba0000ce2-17353340.pdf?src-supplier=Avnet+Europe
footprint CAPACITOR/ALU - SIZE E/SMD - 8X6.2 (CAPACITOR  -  ALUMINIUM - SIZE E / EEEFK - SMD)
pins: 1, 2
text: +

## EEE-1HA220WP
designator EEE?  Supplier Part Number 1: PCE3920DKR-ND
Cap Aluminum 22uF 50V 20% (6.3 X 5.4mm) SMD 40mA 1000h 85 C T/R; Manufacturer: Panasonic; Manufacturer Part Number: EEE-1HA220WP; Life (Hours): 1000Hour; Leakage Current: 3uA; Supplier 1: Digi-Key; RoHS: Yes; Category: Aluminum Electrolytic Capacitors; Pricing 1: 1=0.45000, 10=0.31200, 50=0.21860, 100=0.18730, 500=0.14050 (USD); Mount: Surface Mount,PCB; Case/Package: Radial; Contact Plating: Tin; Min Operating Temperature: -40°C; Max Operating Temperature: 85°C; Capacitance: 22uF; Voltage Rating: 50V; Tolerance: 20%; Ripple Current: 40mA; Packaging: Tape and Reel; Package Quantity: 1; Termination: SMD/SMT; Ripple Current (AC): 40mA; Voltage Rating (DC): 50V; Voltage: 50V; Series: S; Construction: Cylindrical; Diameter: 6.3mm; Length: 5.5mm; Height: 5.4mm; Height - Seated (Max): 0.213inch; Radiation Hardening: No; REACH SVHC: Unknown; Lead Free: Lead Free; RoHS Compliant: Yes; ComponentLink1URL: https://datasheet.ciiva.com/14607/70255710-14607339.pdf?src-supplier=Allied+Electronics; ComponentLink1Description: https://datasheet.ciiva.com/14607/70255710-14607339.pdf?src-supplier=Allied+Electronics; ComponentLink2URL: https://datasheet.ciiva.com/14597/70255710-14597879.pdf?src-supplier=Allied+Electronics; ComponentLink2Description: https://datasheet.ciiva.com/14597/70255710-14597879.pdf?src-supplier=Allied+Electronics; ComponentLink3URL: https://datasheet.ciiva.com/16397/aba0000ce2-16397355.pdf?src-supplier=Future+Electronics; ComponentLink3Description: https://datasheet.ciiva.com/16397/aba0000ce2-16397355.pdf?src-supplier=Future+Electronics; ComponentLink4URL: https://datasheet.ciiva.com/2985/aba0000ce2-2985158.pdf?src-supplier=Avnet; ComponentLink4Description: https://datasheet.ciiva.com/2985/aba0000ce2-2985158.pdf?src-supplier=Avnet; ComponentLink5URL: https://datasheet.ciiva.com/30083/11aba0000ce2-30083754.pdf?src-supplier=Onlinecomponents.com; ComponentLink5Description: https://datasheet.ciiva.com/30083/11aba0000ce2-30083754.pdf?src-supplier=Onlinecomponents.com; ComponentLink6URL: https://datasheet.ciiva.com/17353/aba0000ce2-17353342.pdf?src-supplier=Avnet+Europe; ComponentLink6Description: https://datasheet.ciiva.com/17353/aba0000ce2-17353342.pdf?src-supplier=Avnet+Europe
footprint CAPACITOR/ALU - SIZE D/SMD - 6.3X5.4 (CAPACITOR  -  ALUMINIUM - SIZE D / EEEFK - SMD)
pins: 1, 2
text: +

## EEE-1HA221P
designator EEE?  Supplier Part Number 1: 1763747
Cap Aluminum 220uF 50V 20% (10 X 10.2mm) SMD 300mA 2000h 85°C T/R; Manufacturer: Panasonic; Manufacturer Part Number: EEE-1HA221P; Polarity: Polar; Life (Hours): 2000Hour; Leakage Current: 3uA; Supplier 1: RSComponents; RoHS: Yes; Category: Aluminum Electrolytic Capacitors; Stock 1: 90; Pricing 1: 500=0.37700, 1500=0.35700, 500=0.27200, 1500=0.25800 (USD); Mount: Surface Mount,PCB; Case/Package: Radial; Contact Plating: Tin; Min Operating Temperature: -40°C; Max Operating Temperature: 85°C; Packaging: Tape and Reel; Capacitance: 220uF; Tolerance: 20%; Ripple Current: 300mA; Voltage Rating: 50V; Package Quantity: 500; Voltage Rating (DC): 50V; Termination: SMD/SMT; Ripple Current (AC): 300mA; Voltage: 50V; Series: S; Construction: Cylindrical; Diameter: 10mm; Length: 10.5mm; Height: 10.2mm; Height - Seated (Max): 0.402inch; Radiation Hardening: No; Lead Free: Lead Free; REACH SVHC: No SVHC; RoHS Compliant: Yes; ComponentLink1URL: https://datasheet.ciiva.com/43470/aba0000ce2-43470670.pdf?src-supplier=Farnell; ComponentLink1Description: https://datasheet.ciiva.com/43470/aba0000ce2-43470670.pdf?src-supplier=Farnell; ComponentLink2URL: https://datasheet.ciiva.com/46378/aba0000ce2-46378282.pdf?src-supplier=Element14; ComponentLink2Description: https://datasheet.ciiva.com/46378/aba0000ce2-46378282.pdf?src-supplier=Element14; ComponentLink3URL: https://datasheet.ciiva.com/46374/aba0000ce2-46374381.pdf?src-supplier=Element14; ComponentLink3Description: https://datasheet.ciiva.com/46374/aba0000ce2-46374381.pdf?src-supplier=Element14; ComponentLink4URL: https://datasheet.ciiva.com/14603/70255710-14603436.pdf?src-supplier=Allied+Electronics; ComponentLink4Description: https://datasheet.ciiva.com/14603/70255710-14603436.pdf?src-supplier=Allied+Electronics; ComponentLink5URL: https://datasheet.ciiva.com/11680/aba0000ce2-11680010.pdf?src-supplier=Avnet; ComponentLink5Description: https://datasheet.ciiva.com/11680/aba0000ce2-11680010.pdf?src-supplier=Avnet; ComponentLink6URL: https://datasheet.ciiva.com/16202/aba0000ce2-16202763.pdf?src-supplier=Future+Electronics; ComponentLink6Description: https://datasheet.ciiva.com/16202/aba0000ce2-16202763.pdf?src-supplier=Future+Electronics; ComponentLink7URL: https://datasheet.ciiva.com/30175/11aba0000ce2-30175045.pdf?src-supplier=Onlinecomponents.com; ComponentLink7Description: https://datasheet.ciiva.com/30175/11aba0000ce2-30175045.pdf?src-supplier=Onlinecomponents.com; ComponentLink8URL: https://datasheet.ciiva.com/17534/aba0000ce2-17534827.pdf?src-supplier=Avnet+Europe; ComponentLink8Description: https://datasheet.ciiva.com/17534/aba0000ce2-17534827.pdf?src-supplier=Avnet+Europe
footprint CAPACITOR/ALU - SIZE G/SMD - 10X10.2 (CAPACITOR  -  ALUMINIUM - SIZE G / EEEFK - SMD)
pins: 1, 2
text: +

## EEE-1HA330P
designator EEE?  Supplier Part Number 1: EEE-1HA330P
Cap Aluminum 33uF 50V 20% (8 X 10.2mm) SMD 110mA 2000 hr 85°C T/R; Manufacturer: Panasonic; Life (Hours): 2000Hour; Supplier 1: Arrow Electronics; Manufacturer Part Number: EEE-1HA330P; RoHS: Yes; Category: Aluminum Electrolytic Capacitors; Stock 1: 5; Pricing 1: 1=0.58270 (USD); Mount: Surface Mount,PCB; Case/Package: Radial; Min Operating Temperature: -40°C; Max Operating Temperature: 85°C; Capacitance: 33uF; Voltage Rating: 50V; Tolerance: 20%; Ripple Current: 110mA; Packaging: Tape and Reel; Package Quantity: 1; Voltage Rating (DC): 50V; Termination: SMD/SMT; Series: S; Construction: Cylindrical; Diameter: 8mm; Length: 10.5mm; Height: 10.2mm; Height - Seated (Max): 0.402inch; Radiation Hardening: No; Lead Free: Lead Free; RoHS Compliant: Yes; ComponentLink1URL: https://datasheet.ciiva.com/14598/70255710-14598683.pdf?src-supplier=Allied+Electronics; ComponentLink1Description: https://datasheet.ciiva.com/14598/70255710-14598683.pdf?src-supplier=Allied+Electronics; ComponentLink2URL: https://datasheet.ciiva.com/2985/aba0000ce2-2985164.pdf?src-supplier=Avnet; ComponentLink2Description: https://datasheet.ciiva.com/2985/aba0000ce2-2985164.pdf?src-supplier=Avnet; ComponentLink3URL: https://datasheet.ciiva.com/14601/70255710-14601932.pdf?src-supplier=Allied+Electronics; ComponentLink3Description: https://datasheet.ciiva.com/14601/70255710-14601932.pdf?src-supplier=Allied+Electronics
footprint CAPACITOR/ALU - SIZE F/SMD - 8X10.2 (CAPACITOR  -  ALUMINIUM - SIZE F / EEEFK - SMD)
pins: 1, 2
text: +

## EEE-1HA330UP
designator EEE?  Supplier Part Number 1: PCE3924CT-ND
Cap Aluminum 33uF 50V 20% (8 X 6.2mm) SMD 65mA 2000 hr 85°C T/R; Manufacturer: Panasonic; Manufacturer Part Number: EEE-1HA330UP; Dielectric Material: Aluminium; Life (Hours): 2000Hour; Leakage Current: 16.5uA; Supplier 1: Digi-Key; RoHS: Yes; Category: Aluminum Electrolytic Capacitors; Stock 1: 52; Pricing 1: 1=0.50000, 10=0.35500, 50=0.26800, 100=0.23350, 500=0.17296 (USD); Mount: Surface Mount,PCB; Case/Package: Radial; Contact Plating: Tin; Min Operating Temperature: -40°C; Max Operating Temperature: 85°C; Capacitance: 33uF; Ripple Current: 65mA; Tolerance: 20%; Packaging: Tape and Reel; Package Quantity: 1; Voltage Rating: 50V; Voltage Rating (DC): 50V; Termination: SMD/SMT; Series: S; Construction: Cylindrical; Ripple Current (AC): 65mA; Voltage: 50V; Diameter: 8mm; Length: 6.5mm; Height: 6.2mm; Height - Seated (Max): 0.244inch; Radiation Hardening: No; Lead Free: Lead Free; RoHS Compliant: Yes; REACH SVHC: No SVHC; ComponentLink1URL: https://datasheet.ciiva.com/43470/aba0000ce2-43470662.pdf?src-supplier=Farnell; ComponentLink1Description: https://datasheet.ciiva.com/43470/aba0000ce2-43470662.pdf?src-supplier=Farnell; ComponentLink2URL: https://datasheet.ciiva.com/31414/aba0000ce2-31414679.pdf?src-supplier=Farnell; ComponentLink2Description: https://datasheet.ciiva.com/31414/aba0000ce2-31414679.pdf?src-supplier=Farnell; ComponentLink3URL: https://datasheet.ciiva.com/46374/aba0000ce2-46374378.pdf?src-supplier=Element14; ComponentLink3Description: https://datasheet.ciiva.com/46374/aba0000ce2-46374378.pdf?src-supplier=Element14; ComponentLink4URL: https://datasheet.ciiva.com/15165/getdatasheetpartid-33943-15165628.pdf?src-supplier=Verical; ComponentLink4Description: https://datasheet.ciiva.com/15165/getdatasheetpartid-33943-15165628.pdf?src-supplier=Verical; ComponentLink5URL: https://datasheet.ciiva.com/30052/11aba0000ce2-30052734.pdf?src-supplier=Onlinecomponents.com; ComponentLink5Description: https://datasheet.ciiva.com/30052/11aba0000ce2-30052734.pdf?src-supplier=Onlinecomponents.com; ComponentLink6URL: https://datasheet.ciiva.com/46378/aba0000ce2-46378357.pdf?src-supplier=Element14; ComponentLink6Description: https://datasheet.ciiva.com/46378/aba0000ce2-46378357.pdf?src-supplier=Element14; ComponentLink7URL: https://datasheet.ciiva.com/14608/70255710-14608181.pdf?src-supplier=Allied+Electronics; ComponentLink7Description: https://datasheet.ciiva.com/14608/70255710-14608181.pdf?src-supplier=Allied+Electronics; ComponentLink8URL: https://datasheet.ciiva.com/17536/aba0000ce2-17536172.pdf?src-supplier=Avnet+Europe; ComponentLink8Description: https://datasheet.ciiva.com/17536/aba0000ce2-17536172.pdf?src-supplier=Avnet+Europe
footprint CAPACITOR/ALU - SIZE E/SMD - 8X6.2 (CAPACITOR  -  ALUMINIUM - SIZE E / EEEFK - SMD)
pins: 1, 2
